# Altium footprint library ref-packages.PCBLIB: 1544 footprints (part 34 of 103)
Each footprint in its own frame and in the unit in brackets; x right, y up, seen from the top. Pads: shape width x height; smd on the part's side, far side on the other; paste and mask are expansions set on the pad; w line width, h text height; cw(c..) or ccw(c..) is an arc to the next point about the centre after c.
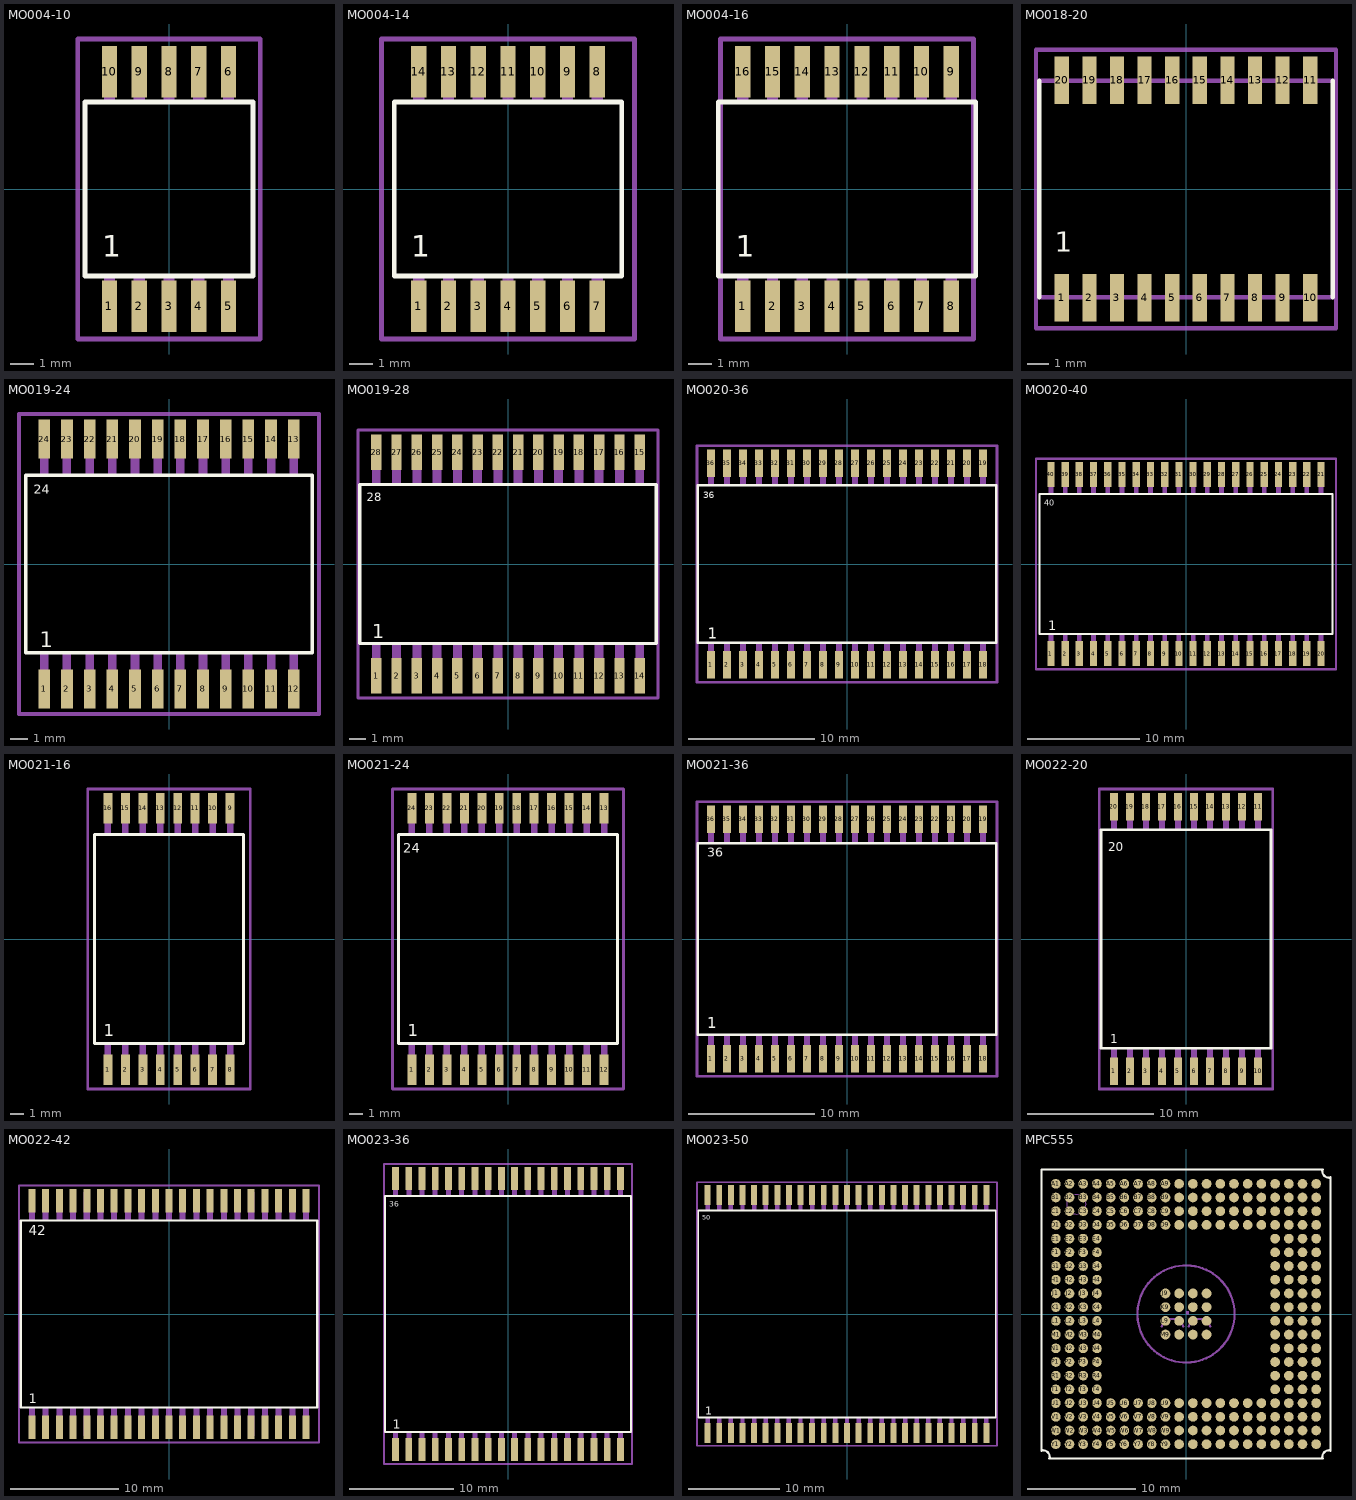
[diagram p33: the footprints below, top view; thin cyan lines are the x and y axes]

## MO004-10 [mm]
pads (10):
  rect 0.65x2.2 smd: 1(-2.54,-5) 2(-1.27,-5) 3(0,-5) 4(1.27,-5) 5(2.54,-5) 6(2.54,5) 7(1.27,5) 8(0,5) 9(-1.27,5) 10(-2.54,5)
Top Overlay:
  lines w0.203: -3.585,-3.71 3.585,-3.71 3.585,3.71 -3.585,3.71 -3.585,-3.71
  text "1" at -2.851,-3.205 h1.57
Mechanical 16:
  rectangle: -2.78,-5.8 -2.3,-3.71
  rectangle: -1.51,-5.8 -1.03,-3.71
  rectangle: -0.24,-5.8 0.24,-3.71
  rectangle: 1.03,-5.8 1.51,-3.71
  rectangle: 2.3,-5.8 2.78,-3.71
  rectangle: 2.3,3.71 2.78,5.8
  rectangle: 1.03,3.71 1.51,5.8
  rectangle: -0.24,3.71 0.24,5.8
  rectangle: -1.51,3.71 -1.03,5.8
  rectangle: -2.78,3.71 -2.3,5.8
Mechanical 27:
  lines w0.2: -3.9,-6.4 -3.9,6.4 3.9,6.4 3.9,-6.4 -3.9,-6.4

## MO004-14 [mm]
pads (14):
  rect 0.65x2.2 smd: 1(-3.81,-5) 2(-2.54,-5) 3(-1.27,-5) 4(0,-5) 5(1.27,-5) 6(2.54,-5) 7(3.81,-5) 8(3.81,5) 9(2.54,5) 10(1.27,5) 11(0,5) 12(-1.27,5) 13(-2.54,5) 14(-3.81,5)
Top Overlay:
  lines w0.203: -4.855,-3.71 4.855,-3.71 4.855,3.71 -4.855,3.71 -4.855,-3.71
  text "1" at -4.121,-3.205 h1.57
Mechanical 16:
  rectangle: -4.05,-5.8 -3.57,-3.71
  rectangle: -2.78,-5.8 -2.3,-3.71
  rectangle: -1.51,-5.8 -1.03,-3.71
  rectangle: -0.24,-5.8 0.24,-3.71
  rectangle: 1.03,-5.8 1.51,-3.71
  rectangle: 2.3,-5.8 2.78,-3.71
  rectangle: 3.57,-5.8 4.05,-3.71
  rectangle: 3.57,3.71 4.05,5.8
  rectangle: 2.3,3.71 2.78,5.8
  rectangle: 1.03,3.71 1.51,5.8
  rectangle: -0.24,3.71 0.24,5.8
  rectangle: -1.51,3.71 -1.03,5.8
  rectangle: -2.78,3.71 -2.3,5.8
  rectangle: -4.05,3.71 -3.57,5.8
Mechanical 27:
  lines w0.2: -5.4,-6.4 -5.4,6.4 5.4,6.4 5.4,-6.4 -5.4,-6.4

## MO004-16 [mm]
pads (16):
  rect 0.65x2.2 smd: 1(-4.445,-5) 2(-3.175,-5) 3(-1.905,-5) 4(-0.635,-5) 5(0.635,-5) 6(1.905,-5) 7(3.175,-5) 8(4.445,-5) 9(4.445,5) 10(3.175,5) 11(1.905,5) 12(0.635,5) 13(-0.635,5) 14(-1.905,5) 15(-3.175,5) 16(-4.445,5)
Top Overlay:
  lines w0.203: -5.49,-3.71 5.49,-3.71 5.49,3.71 -5.49,3.71 -5.49,-3.71
  text "1" at -4.756,-3.205 h1.57
Mechanical 16:
  rectangle: -4.685,-5.8 -4.205,-3.71
  rectangle: -3.415,-5.8 -2.935,-3.71
  rectangle: -2.145,-5.8 -1.665,-3.71
  rectangle: -0.875,-5.8 -0.395,-3.71
  rectangle: 0.395,-5.8 0.875,-3.71
  rectangle: 1.665,-5.8 2.145,-3.71
  rectangle: 2.935,-5.8 3.415,-3.71
  rectangle: 4.205,-5.8 4.685,-3.71
  rectangle: 4.205,3.71 4.685,5.8
  rectangle: 2.935,3.71 3.415,5.8
  rectangle: 1.665,3.71 2.145,5.8
  rectangle: 0.395,3.71 0.875,5.8
  rectangle: -0.875,3.71 -0.395,5.8
  rectangle: -2.145,3.71 -1.665,5.8
  rectangle: -3.415,3.71 -2.935,5.8
  rectangle: -4.685,3.71 -4.205,5.8
Mechanical 27:
  lines w0.2: -5.4,-6.4 -5.4,6.4 5.4,6.4 5.4,-6.4 -5.4,-6.4

## MO018-20 [mm]
pads (20):
  rect 0.65x2.2 smd: 1(-5.715,-5) 2(-4.445,-5) 3(-3.175,-5) 4(-1.905,-5) 5(-0.635,-5) 6(0.635,-5) 7(1.905,-5) 8(3.175,-5) 9(4.445,-5) 10(5.715,-5) 11(5.715,5) 12(4.445,5) 13(3.175,5) 14(1.905,5) 15(0.635,5) 16(-0.635,5) 17(-1.905,5) 18(-3.175,5) 19(-4.445,5) 20(-5.715,5)
Top Overlay:
  lines w0.203: -6.745,-4.98 -6.745,4.98 ; 6.745,-4.98 6.745,4.98
  text "1" at -6.026,-3.205 h1.57
Mechanical 16:
  rectangle: -5.885,-5.8 -5.545,-4.98
  rectangle: -4.615,-5.8 -4.275,-4.98
  rectangle: -3.345,-5.8 -3.005,-4.98
  rectangle: -2.075,-5.8 -1.735,-4.98
  rectangle: -0.805,-5.8 -0.465,-4.98
  rectangle: 0.465,-5.8 0.805,-4.98
  rectangle: 1.735,-5.8 2.075,-4.98
  rectangle: 3.005,-5.8 3.345,-4.98
  rectangle: 4.275,-5.8 4.615,-4.98
  rectangle: 5.545,-5.8 5.885,-4.98
  rectangle: 5.545,4.98 5.885,5.8
  rectangle: 4.275,4.98 4.615,5.8
  rectangle: 3.005,4.98 3.345,5.8
  rectangle: 1.735,4.98 2.075,5.8
  rectangle: 0.465,4.98 0.805,5.8
  rectangle: -0.805,4.98 -0.465,5.8
  rectangle: -2.075,4.98 -1.735,5.8
  rectangle: -3.345,4.98 -3.005,5.8
  rectangle: -4.615,4.98 -4.275,5.8
  rectangle: -5.885,4.98 -5.545,5.8
  lines w0.203: -6.745,-4.98 6.745,-4.98 ; -6.745,4.98 6.745,4.98
Mechanical 27:
  lines w0.2: -6.9,-6.4 -6.9,6.4 6.9,6.4 6.9,-6.4 -6.9,-6.4

## MO019-24 [mm]
pads (24):
  rect 0.65x2.2 smd: 1(-6.985,-7) 2(-5.715,-7) 3(-4.445,-7) 4(-3.175,-7) 5(-1.905,-7) 6(-0.635,-7) 7(0.635,-7) 8(1.905,-7) 9(3.175,-7) 10(4.445,-7) 11(5.715,-7) 12(6.985,-7) 13(6.985,7) 14(5.715,7) 15(4.445,7) 16(3.175,7) 17(1.905,7) 18(0.635,7) 19(-0.635,7) 20(-1.905,7) 21(-3.175,7) 22(-4.445,7) 23(-5.715,7) 24(-6.985,7)
Top Overlay:
  lines w0.203: -8.015,-4.98 8.015,-4.98 8.015,4.98 -8.015,4.98 -8.015,-4.98
  text "1" at -7.236,-4.665 h0.86
  text "24" at -7.576,3.93 h0.52
Mechanical 16:
  rectangle: -7.225,-7.8 -6.745,-5
  rectangle: -5.955,-7.8 -5.475,-5
  rectangle: -4.685,-7.8 -4.205,-5
  rectangle: -3.415,-7.8 -2.935,-5
  rectangle: -2.145,-7.8 -1.665,-5
  rectangle: -0.875,-7.8 -0.395,-5
  rectangle: 0.395,-7.8 0.875,-5
  rectangle: 1.665,-7.8 2.145,-5
  rectangle: 2.935,-7.8 3.415,-5
  rectangle: 4.205,-7.8 4.685,-5
  rectangle: 5.475,-7.8 5.955,-5
  rectangle: 6.745,-7.8 7.225,-5
  rectangle: 6.745,5 7.225,7.8
  rectangle: 5.475,5 5.955,7.8
  rectangle: 4.205,5 4.685,7.8
  rectangle: 2.935,5 3.415,7.8
  rectangle: 1.665,5 2.145,7.8
  rectangle: 0.395,5 0.875,7.8
  rectangle: -0.875,5 -0.395,7.8
  rectangle: -2.145,5 -1.665,7.8
  rectangle: -3.415,5 -2.935,7.8
  rectangle: -4.685,5 -4.205,7.8
  rectangle: -5.955,5 -5.475,7.8
  rectangle: -7.225,5 -6.745,7.8
Mechanical 27:
  lines w0.2: -8.4,-8.4 -8.4,8.4 8.4,8.4 8.4,-8.4 -8.4,-8.4

## MO019-28 [mm]
pads (28):
  rect 0.65x2.2 smd: 1(-8.255,-7) 2(-6.985,-7) 3(-5.715,-7) 4(-4.445,-7) 5(-3.175,-7) 6(-1.905,-7) 7(-0.635,-7) 8(0.635,-7) 9(1.905,-7) 10(3.175,-7) 11(4.445,-7) 12(5.715,-7) 13(6.985,-7) 14(8.255,-7) 15(8.255,7) 16(6.985,7) 17(5.715,7) 18(4.445,7) 19(3.175,7) 20(1.905,7) 21(0.635,7) 22(-0.635,7) 23(-1.905,7) 24(-3.175,7) 25(-4.445,7) 26(-5.715,7) 27(-6.985,7) 28(-8.255,7)
Top Overlay:
  lines w0.203: -9.285,-4.98 9.285,-4.98 9.285,4.98 -9.285,4.98 -9.285,-4.98
  text "1" at -8.506,-4.665 h0.86
  text "28" at -8.846,3.93 h0.52
Mechanical 16:
  rectangle: -8.535,-7.8 -7.975,-5
  rectangle: -7.265,-7.8 -6.705,-5
  rectangle: -5.995,-7.8 -5.435,-5
  rectangle: -4.725,-7.8 -4.165,-5
  rectangle: -3.455,-7.8 -2.895,-5
  rectangle: -2.185,-7.8 -1.625,-5
  rectangle: -0.915,-7.8 -0.355,-5
  rectangle: 0.355,-7.8 0.915,-5
  rectangle: 1.625,-7.8 2.185,-5
  rectangle: 2.895,-7.8 3.455,-5
  rectangle: 4.165,-7.8 4.725,-5
  rectangle: 5.435,-7.8 5.995,-5
  rectangle: 6.705,-7.8 7.265,-5
  rectangle: 7.975,-7.8 8.535,-5
  rectangle: 7.975,5 8.535,7.8
  rectangle: 6.705,5 7.265,7.8
  rectangle: 5.435,5 5.995,7.8
  rectangle: 4.165,5 4.725,7.8
  rectangle: 2.895,5 3.455,7.8
  rectangle: 1.625,5 2.185,7.8
  rectangle: 0.355,5 0.915,7.8
  rectangle: -0.915,5 -0.355,7.8
  rectangle: -2.185,5 -1.625,7.8
  rectangle: -3.455,5 -2.895,7.8
  rectangle: -4.725,5 -4.165,7.8
  rectangle: -5.995,5 -5.435,7.8
  rectangle: -7.265,5 -6.705,7.8
  rectangle: -8.535,5 -7.975,7.8
Mechanical 27:
  lines w0.2: -9.4,-8.4 -9.4,8.4 9.4,8.4 9.4,-8.4 -9.4,-8.4

## MO020-36 [mm]
pads (36):
  rect 0.65x2.2 smd: 1(-10.795,-8) 2(-9.525,-8) 3(-8.255,-8) 4(-6.985,-8) 5(-5.715,-8) 6(-4.445,-8) 7(-3.175,-8) 8(-1.905,-8) 9(-0.635,-8) 10(0.635,-8) 11(1.905,-8) 12(3.175,-8) 13(4.445,-8) 14(5.715,-8) 15(6.985,-8) 16(8.255,-8) 17(9.525,-8) 18(10.795,-8) 19(10.795,8) 20(9.525,8) 21(8.255,8) 22(6.985,8) 23(5.715,8) 24(4.445,8) 25(3.175,8) 26(1.905,8) 27(0.635,8) 28(-0.635,8) 29(-1.905,8) 30(-3.175,8) 31(-4.445,8) 32(-5.715,8) 33(-6.985,8) 34(-8.255,8) 35(-9.525,8) 36(-10.795,8)
Top Overlay:
  lines w0.203: -11.825,-6.25 11.825,-6.25 11.825,6.25 -11.825,6.25 -11.825,-6.25
  text "1" at -11.046,-5.935 h0.86
  text "36" at -11.386,5.2 h0.52
Mechanical 16:
  rectangle: -11.035,-8.8 -10.555,-6.25
  rectangle: -9.765,-8.8 -9.285,-6.25
  rectangle: -8.495,-8.8 -8.015,-6.25
  rectangle: -7.225,-8.8 -6.745,-6.25
  rectangle: -5.955,-8.8 -5.475,-6.25
  rectangle: -4.685,-8.8 -4.205,-6.25
  rectangle: -3.415,-8.8 -2.935,-6.25
  rectangle: -2.145,-8.8 -1.665,-6.25
  rectangle: -0.875,-8.8 -0.395,-6.25
  rectangle: 0.395,-8.8 0.875,-6.25
  rectangle: 1.665,-8.8 2.145,-6.25
  rectangle: 2.935,-8.8 3.415,-6.25
  rectangle: 4.205,-8.8 4.685,-6.25
  rectangle: 5.475,-8.8 5.955,-6.25
  rectangle: 6.745,-8.8 7.225,-6.25
  rectangle: 8.015,-8.8 8.495,-6.25
  rectangle: 9.285,-8.8 9.765,-6.25
  rectangle: 10.555,-8.8 11.035,-6.25
  rectangle: 10.555,6.25 11.035,8.8
  rectangle: 9.285,6.25 9.765,8.8
  rectangle: 8.015,6.25 8.495,8.8
  rectangle: 6.745,6.25 7.225,8.8
  rectangle: 5.475,6.25 5.955,8.8
  rectangle: 4.205,6.25 4.685,8.8
  rectangle: 2.935,6.25 3.415,8.8
  rectangle: 1.665,6.25 2.145,8.8
  rectangle: 0.395,6.25 0.875,8.8
  rectangle: -0.875,6.25 -0.395,8.8
  rectangle: -2.145,6.25 -1.665,8.8
  rectangle: -3.415,6.25 -2.935,8.8
  rectangle: -4.685,6.25 -4.205,8.8
  rectangle: -5.955,6.25 -5.475,8.8
  rectangle: -7.225,6.25 -6.745,8.8
  rectangle: -8.495,6.25 -8.015,8.8
  rectangle: -9.765,6.25 -9.285,8.8
  rectangle: -11.035,6.25 -10.555,8.8
Mechanical 27:
  lines w0.2: -11.9,-9.4 -11.9,9.4 11.9,9.4 11.9,-9.4 -11.9,-9.4

## MO020-40 [mm]
pads (40):
  rect 0.65x2.2 smd: 1(-12.065,-8) 2(-10.795,-8) 3(-9.525,-8) 4(-8.255,-8) 5(-6.985,-8) 6(-5.715,-8) 7(-4.445,-8) 8(-3.175,-8) 9(-1.905,-8) 10(-0.635,-8) 11(0.635,-8) 12(1.905,-8) 13(3.175,-8) 14(4.445,-8) 15(5.715,-8) 16(6.985,-8) 17(8.255,-8) 18(9.525,-8) 19(10.795,-8) 20(12.065,-8) 21(12.065,8) 22(10.795,8) 23(9.525,8) 24(8.255,8) 25(6.985,8) 26(5.715,8) 27(4.445,8) 28(3.175,8) 29(1.905,8) 30(0.635,8) 31(-0.635,8) 32(-1.905,8) 33(-3.175,8) 34(-4.445,8) 35(-5.715,8) 36(-6.985,8) 37(-8.255,8) 38(-9.525,8) 39(-10.795,8) 40(-12.065,8)
Top Overlay:
  lines w0.203: -13.095,-6.25 13.095,-6.25 13.095,6.25 -13.095,6.25 -13.095,-6.25
  text "1" at -12.316,-5.935 h0.86
  text "40" at -12.656,5.2 h0.52
Mechanical 16:
  rectangle: -12.275,-8.8 -11.855,-6.25
  rectangle: -11.005,-8.8 -10.585,-6.25
  rectangle: -9.735,-8.8 -9.315,-6.25
  rectangle: -8.465,-8.8 -8.045,-6.25
  rectangle: -7.195,-8.8 -6.775,-6.25
  rectangle: -5.925,-8.8 -5.505,-6.25
  rectangle: -4.655,-8.8 -4.235,-6.25
  rectangle: -3.385,-8.8 -2.965,-6.25
  rectangle: -2.115,-8.8 -1.695,-6.25
  rectangle: -0.845,-8.8 -0.425,-6.25
  rectangle: 0.425,-8.8 0.845,-6.25
  rectangle: 1.695,-8.8 2.115,-6.25
  rectangle: 2.965,-8.8 3.385,-6.25
  rectangle: 4.235,-8.8 4.655,-6.25
  rectangle: 5.505,-8.8 5.925,-6.25
  rectangle: 6.775,-8.8 7.195,-6.25
  rectangle: 8.045,-8.8 8.465,-6.25
  rectangle: 9.315,-8.8 9.735,-6.25
  rectangle: 10.585,-8.8 11.005,-6.25
  rectangle: 11.855,-8.8 12.275,-6.25
  rectangle: 11.855,6.25 12.275,8.8
  rectangle: 10.585,6.25 11.005,8.8
  rectangle: 9.315,6.25 9.735,8.8
  rectangle: 8.045,6.25 8.465,8.8
  rectangle: 6.775,6.25 7.195,8.8
  rectangle: 5.505,6.25 5.925,8.8
  rectangle: 4.235,6.25 4.655,8.8
  rectangle: 2.965,6.25 3.385,8.8
  rectangle: 1.695,6.25 2.115,8.8
  rectangle: 0.425,6.25 0.845,8.8
  rectangle: -0.845,6.25 -0.425,8.8
  rectangle: -2.115,6.25 -1.695,8.8
  rectangle: -3.385,6.25 -2.965,8.8
  rectangle: -4.655,6.25 -4.235,8.8
  rectangle: -5.925,6.25 -5.505,8.8
  rectangle: -7.195,6.25 -6.775,8.8
  rectangle: -8.465,6.25 -8.045,8.8
  rectangle: -9.735,6.25 -9.315,8.8
  rectangle: -11.005,6.25 -10.585,8.8
  rectangle: -12.275,6.25 -11.855,8.8
Mechanical 27:
  lines w0.2: -13.4,-9.4 -13.4,9.4 13.4,9.4 13.4,-9.4 -13.4,-9.4

## MO021-16 [mm]
pads (16):
  rect 0.65x2.2 smd: 1(-4.445,-9.5) 2(-3.175,-9.5) 3(-1.905,-9.5) 4(-0.635,-9.5) 5(0.635,-9.5) 6(1.905,-9.5) 7(3.175,-9.5) 8(4.445,-9.5) 9(4.445,9.5) 10(3.175,9.5) 11(1.905,9.5) 12(0.635,9.5) 13(-0.635,9.5) 14(-1.905,9.5) 15(-3.175,9.5) 16(-4.445,9.5)
Top Overlay:
  lines w0.203: -5.41,-7.585 5.41,-7.585 5.41,7.585 -5.41,7.585 -5.41,-7.585
  text "1" at -4.756,-7.07 h0.86
Mechanical 16:
  rectangle: -4.685,-10.3 -4.205,-7.6
  rectangle: -3.415,-10.3 -2.935,-7.6
  rectangle: -2.145,-10.3 -1.665,-7.6
  rectangle: -0.875,-10.3 -0.395,-7.6
  rectangle: 0.395,-10.3 0.875,-7.6
  rectangle: 1.665,-10.3 2.145,-7.6
  rectangle: 2.935,-10.3 3.415,-7.6
  rectangle: 4.205,-10.3 4.685,-7.6
  rectangle: 4.205,7.6 4.685,10.3
  rectangle: 2.935,7.6 3.415,10.3
  rectangle: 1.665,7.6 2.145,10.3
  rectangle: 0.395,7.6 0.875,10.3
  rectangle: -0.875,7.6 -0.395,10.3
  rectangle: -2.145,7.6 -1.665,10.3
  rectangle: -3.415,7.6 -2.935,10.3
  rectangle: -4.685,7.6 -4.205,10.3
Mechanical 27:
  lines w0.2: -5.9,-10.9 -5.9,10.9 5.9,10.9 5.9,-10.9 -5.9,-10.9

## MO021-24 [mm]
pads (24):
  rect 0.65x2.2 smd: 1(-6.985,-9.5) 2(-5.715,-9.5) 3(-4.445,-9.5) 4(-3.175,-9.5) 5(-1.905,-9.5) 6(-0.635,-9.5) 7(0.635,-9.5) 8(1.905,-9.5) 9(3.175,-9.5) 10(4.445,-9.5) 11(5.715,-9.5) 12(6.985,-9.5) 13(6.985,9.5) 14(5.715,9.5) 15(4.445,9.5) 16(3.175,9.5) 17(1.905,9.5) 18(0.635,9.5) 19(-0.635,9.5) 20(-1.905,9.5) 21(-3.175,9.5) 22(-4.445,9.5) 23(-5.715,9.5) 24(-6.985,9.5)
Top Overlay:
  lines w0.203: -7.95,-7.585 7.95,-7.585 7.95,7.585 -7.95,7.585 -7.95,-7.585
  text "1" at -7.296,-7.07 h0.86
  text "24" at -7.606,6.265 h0.69
Mechanical 16:
  rectangle: -7.225,-10.3 -6.745,-7.6
  rectangle: -5.955,-10.3 -5.475,-7.6
  rectangle: -4.685,-10.3 -4.205,-7.6
  rectangle: -3.415,-10.3 -2.935,-7.6
  rectangle: -2.145,-10.3 -1.665,-7.6
  rectangle: -0.875,-10.3 -0.395,-7.6
  rectangle: 0.395,-10.3 0.875,-7.6
  rectangle: 1.665,-10.3 2.145,-7.6
  rectangle: 2.935,-10.3 3.415,-7.6
  rectangle: 4.205,-10.3 4.685,-7.6
  rectangle: 5.475,-10.3 5.955,-7.6
  rectangle: 6.745,-10.3 7.225,-7.6
  rectangle: 6.745,7.6 7.225,10.3
  rectangle: 5.475,7.6 5.955,10.3
  rectangle: 4.205,7.6 4.685,10.3
  rectangle: 2.935,7.6 3.415,10.3
  rectangle: 1.665,7.6 2.145,10.3
  rectangle: 0.395,7.6 0.875,10.3
  rectangle: -0.875,7.6 -0.395,10.3
  rectangle: -2.145,7.6 -1.665,10.3
  rectangle: -3.415,7.6 -2.935,10.3
  rectangle: -4.685,7.6 -4.205,10.3
  rectangle: -5.955,7.6 -5.475,10.3
  rectangle: -7.225,7.6 -6.745,10.3
Mechanical 27:
  lines w0.2: -8.4,-10.9 -8.4,10.9 8.4,10.9 8.4,-10.9 -8.4,-10.9

## MO021-36 [mm]
pads (36):
  rect 0.65x2.2 smd: 1(-10.795,-9.5) 2(-9.525,-9.5) 3(-8.255,-9.5) 4(-6.985,-9.5) 5(-5.715,-9.5) 6(-4.445,-9.5) 7(-3.175,-9.5) 8(-1.905,-9.5) 9(-0.635,-9.5) 10(0.635,-9.5) 11(1.905,-9.5) 12(3.175,-9.5) 13(4.445,-9.5) 14(5.715,-9.5) 15(6.985,-9.5) 16(8.255,-9.5) 17(9.525,-9.5) 18(10.795,-9.5) 19(10.795,9.5) 20(9.525,9.5) 21(8.255,9.5) 22(6.985,9.5) 23(5.715,9.5) 24(4.445,9.5) 25(3.175,9.5) 26(1.905,9.5) 27(0.635,9.5) 28(-0.635,9.5) 29(-1.905,9.5) 30(-3.175,9.5) 31(-4.445,9.5) 32(-5.715,9.5) 33(-6.985,9.5) 34(-8.255,9.5) 35(-9.525,9.5) 36(-10.795,9.5)
Top Overlay:
  lines w0.203: -11.833,-7.585 11.833,-7.585 11.833,7.585 -11.833,7.585 -11.833,-7.585
  text "1" at -11.106,-7.07 h0.86
  text "36" at -11.106,6.265 h1.26
Mechanical 16:
  rectangle: -11.035,-10.3 -10.555,-7.6
  rectangle: -9.765,-10.3 -9.285,-7.6
  rectangle: -8.495,-10.3 -8.015,-7.6
  rectangle: -7.225,-10.3 -6.745,-7.6
  rectangle: -5.955,-10.3 -5.475,-7.6
  rectangle: -4.685,-10.3 -4.205,-7.6
  rectangle: -3.415,-10.3 -2.935,-7.6
  rectangle: -2.145,-10.3 -1.665,-7.6
  rectangle: -0.875,-10.3 -0.395,-7.6
  rectangle: 0.395,-10.3 0.875,-7.6
  rectangle: 1.665,-10.3 2.145,-7.6
  rectangle: 2.935,-10.3 3.415,-7.6
  rectangle: 4.205,-10.3 4.685,-7.6
  rectangle: 5.475,-10.3 5.955,-7.6
  rectangle: 6.745,-10.3 7.225,-7.6
  rectangle: 8.015,-10.3 8.495,-7.6
  rectangle: 9.285,-10.3 9.765,-7.6
  rectangle: 10.555,-10.3 11.035,-7.6
  rectangle: 10.555,7.6 11.035,10.3
  rectangle: 9.285,7.6 9.765,10.3
  rectangle: 8.015,7.6 8.495,10.3
  rectangle: 6.745,7.6 7.225,10.3
  rectangle: 5.475,7.6 5.955,10.3
  rectangle: 4.205,7.6 4.685,10.3
  rectangle: 2.935,7.6 3.415,10.3
  rectangle: 1.665,7.6 2.145,10.3
  rectangle: 0.395,7.6 0.875,10.3
  rectangle: -0.875,7.6 -0.395,10.3
  rectangle: -2.145,7.6 -1.665,10.3
  rectangle: -3.415,7.6 -2.935,10.3
  rectangle: -4.685,7.6 -4.205,10.3
  rectangle: -5.955,7.6 -5.475,10.3
  rectangle: -7.225,7.6 -6.745,10.3
  rectangle: -8.495,7.6 -8.015,10.3
  rectangle: -9.765,7.6 -9.285,10.3
  rectangle: -11.035,7.6 -10.555,10.3
Mechanical 27:
  lines w0.2: -11.9,-10.9 -11.9,10.9 11.9,10.9 11.9,-10.9 -11.9,-10.9

## MO022-20 [mm]
pads (20):
  rect 0.65x2.2 smd: 1(-5.715,-10.5) 2(-4.445,-10.5) 3(-3.175,-10.5) 4(-1.905,-10.5) 5(-0.635,-10.5) 6(0.635,-10.5) 7(1.905,-10.5) 8(3.175,-10.5) 9(4.445,-10.5) 10(5.715,-10.5) 11(5.715,10.5) 12(4.445,10.5) 13(3.175,10.5) 14(1.905,10.5) 15(0.635,10.5) 16(-0.635,10.5) 17(-1.905,10.5) 18(-3.175,10.5) 19(-4.445,10.5) 20(-5.715,10.5)
Top Overlay:
  lines w0.203: -6.745,-8.655 6.745,-8.655 6.745,8.655 -6.745,8.655 -6.745,-8.655
  text "1" at -6.026,-8.285 h0.69
  text "20" at -6.161,6.955 h0.69
Mechanical 16:
  rectangle: -5.955,-11.3 -5.475,-8.6
  rectangle: -4.685,-11.3 -4.205,-8.6
  rectangle: -3.415,-11.3 -2.935,-8.6
  rectangle: -2.145,-11.3 -1.665,-8.6
  rectangle: -0.875,-11.3 -0.395,-8.6
  rectangle: 0.395,-11.3 0.875,-8.6
  rectangle: 1.665,-11.3 2.145,-8.6
  rectangle: 2.935,-11.3 3.415,-8.6
  rectangle: 4.205,-11.3 4.685,-8.6
  rectangle: 5.475,-11.3 5.955,-8.6
  rectangle: 5.475,8.6 5.955,11.3
  rectangle: 4.205,8.6 4.685,11.3
  rectangle: 2.935,8.6 3.415,11.3
  rectangle: 1.665,8.6 2.145,11.3
  rectangle: 0.395,8.6 0.875,11.3
  rectangle: -0.875,8.6 -0.395,11.3
  rectangle: -2.145,8.6 -1.665,11.3
  rectangle: -3.415,8.6 -2.935,11.3
  rectangle: -4.685,8.6 -4.205,11.3
  rectangle: -5.955,8.6 -5.475,11.3
Mechanical 27:
  lines w0.2: -6.9,-11.9 -6.9,11.9 6.9,11.9 6.9,-11.9 -6.9,-11.9

## MO022-42 [mm]
pads (42):
  rect 0.65x2.2 smd: 1(-12.7,-10.5) 2(-11.43,-10.5) 3(-10.16,-10.5) 4(-8.89,-10.5) 5(-7.62,-10.5) 6(-6.35,-10.5) 7(-5.08,-10.5) 8(-3.81,-10.5) 9(-2.54,-10.5) 10(-1.27,-10.5) 11(0,-10.5) 12(1.27,-10.5) 13(2.54,-10.5) 14(3.81,-10.5) 15(5.08,-10.5) 16(6.35,-10.5) 17(7.62,-10.5) 18(8.89,-10.5) 19(10.16,-10.5) 20(11.43,-10.5) 21(12.7,-10.5) 22(12.7,10.5) 23(11.43,10.5) 24(10.16,10.5) 25(8.89,10.5) 26(7.62,10.5) 27(6.35,10.5) 28(5.08,10.5) 29(3.81,10.5) 30(2.54,10.5) 31(1.27,10.5) 32(0,10.5) 33(-1.27,10.5) 34(-2.54,10.5) 35(-3.81,10.5) 36(-5.08,10.5) 37(-6.35,10.5) 38(-7.62,10.5) 39(-8.89,10.5) 40(-10.16,10.5) 41(-11.43,10.5) 42(-12.7,10.5)
Top Overlay:
  lines w0.203: -13.73,-8.655 13.73,-8.655 13.73,8.655 -13.73,8.655 -13.73,-8.655
  text "1" at -13.011,-8.285 h0.86
  text "42" at -13.011,6.955 h1.57
Mechanical 16:
  rectangle: -12.98,-11.3 -12.42,-8.6
  rectangle: -11.71,-11.3 -11.15,-8.6
  rectangle: -10.44,-11.3 -9.88,-8.6
  rectangle: -9.17,-11.3 -8.61,-8.6
  rectangle: -7.9,-11.3 -7.34,-8.6
  rectangle: -6.63,-11.3 -6.07,-8.6
  rectangle: -5.36,-11.3 -4.8,-8.6
  rectangle: -4.09,-11.3 -3.53,-8.6
  rectangle: -2.82,-11.3 -2.26,-8.6
  rectangle: -1.55,-11.3 -0.99,-8.6
  rectangle: -0.28,-11.3 0.28,-8.6
  rectangle: 0.99,-11.3 1.55,-8.6
  rectangle: 2.26,-11.3 2.82,-8.6
  rectangle: 3.53,-11.3 4.09,-8.6
  rectangle: 4.8,-11.3 5.36,-8.6
  rectangle: 6.07,-11.3 6.63,-8.6
  rectangle: 7.34,-11.3 7.9,-8.6
  rectangle: 8.61,-11.3 9.17,-8.6
  rectangle: 9.88,-11.3 10.44,-8.6
  rectangle: 11.15,-11.3 11.71,-8.6
  rectangle: 12.42,-11.3 12.98,-8.6
  rectangle: 12.42,8.6 12.98,11.3
  rectangle: 11.15,8.6 11.71,11.3
  rectangle: 9.88,8.6 10.44,11.3
  rectangle: 8.61,8.6 9.17,11.3
  rectangle: 7.34,8.6 7.9,11.3
  rectangle: 6.07,8.6 6.63,11.3
  rectangle: 4.8,8.6 5.36,11.3
  rectangle: 3.53,8.6 4.09,11.3
  rectangle: 2.26,8.6 2.82,11.3
  rectangle: 0.99,8.6 1.55,11.3
  rectangle: -0.28,8.6 0.28,11.3
  rectangle: -1.55,8.6 -0.99,11.3
  rectangle: -2.82,8.6 -2.26,11.3
  rectangle: -4.09,8.6 -3.53,11.3
  rectangle: -5.36,8.6 -4.8,11.3
  rectangle: -6.63,8.6 -6.07,11.3
  rectangle: -7.9,8.6 -7.34,11.3
  rectangle: -9.17,8.6 -8.61,11.3
  rectangle: -10.44,8.6 -9.88,11.3
  rectangle: -11.71,8.6 -11.15,11.3
  rectangle: -12.98,8.6 -12.42,11.3
Mechanical 27:
  lines w0.2: -13.9,-11.9 -13.9,11.9 13.9,11.9 13.9,-11.9 -13.9,-11.9

## MO023-36 [mm]
pads (36):
  rect 0.65x2.2 smd: 1(-10.795,-13) 2(-9.525,-13) 3(-8.255,-13) 4(-6.985,-13) 5(-5.715,-13) 6(-4.445,-13) 7(-3.175,-13) 8(-1.905,-13) 9(-0.635,-13) 10(0.635,-13) 11(1.905,-13) 12(3.175,-13) 13(4.445,-13) 14(5.715,-13) 15(6.985,-13) 16(8.255,-13) 17(9.525,-13) 18(10.795,-13) 19(10.795,13) 20(9.525,13) 21(8.255,13) 22(6.985,13) 23(5.715,13) 24(4.445,13) 25(3.175,13) 26(1.905,13) 27(0.635,13) 28(-0.635,13) 29(-1.905,13) 30(-3.175,13) 31(-4.445,13) 32(-5.715,13) 33(-6.985,13) 34(-8.255,13) 35(-9.525,13) 36(-10.795,13)
Top Overlay:
  lines w0.203: -11.825,-11.33 11.825,-11.33 11.825,11.33 -11.825,11.33 -11.825,-11.33
  text "1" at -11.046,-11.015 h0.86
  text "36" at -11.386,10.28 h0.52
Mechanical 16:
  rectangle: -11.035,-13.8 -10.555,-11.25
  rectangle: -9.765,-13.8 -9.285,-11.25
  rectangle: -8.495,-13.8 -8.015,-11.25
  rectangle: -7.225,-13.8 -6.745,-11.25
  rectangle: -5.955,-13.8 -5.475,-11.25
  rectangle: -4.685,-13.8 -4.205,-11.25
  rectangle: -3.415,-13.8 -2.935,-11.25
  rectangle: -2.145,-13.8 -1.665,-11.25
  rectangle: -0.875,-13.8 -0.395,-11.25
  rectangle: 0.395,-13.8 0.875,-11.25
  rectangle: 1.665,-13.8 2.145,-11.25
  rectangle: 2.935,-13.8 3.415,-11.25
  rectangle: 4.205,-13.8 4.685,-11.25
  rectangle: 5.475,-13.8 5.955,-11.25
  rectangle: 6.745,-13.8 7.225,-11.25
  rectangle: 8.015,-13.8 8.495,-11.25
  rectangle: 9.285,-13.8 9.765,-11.25
  rectangle: 10.555,-13.8 11.035,-11.25
  rectangle: 10.555,11.25 11.035,13.8
  rectangle: 9.285,11.25 9.765,13.8
  rectangle: 8.015,11.25 8.495,13.8
  rectangle: 6.745,11.25 7.225,13.8
  rectangle: 5.475,11.25 5.955,13.8
  rectangle: 4.205,11.25 4.685,13.8
  rectangle: 2.935,11.25 3.415,13.8
  rectangle: 1.665,11.25 2.145,13.8
  rectangle: 0.395,11.25 0.875,13.8
  rectangle: -0.875,11.25 -0.395,13.8
  rectangle: -2.145,11.25 -1.665,13.8
  rectangle: -3.415,11.25 -2.935,13.8
  rectangle: -4.685,11.25 -4.205,13.8
  rectangle: -5.955,11.25 -5.475,13.8
  rectangle: -7.225,11.25 -6.745,13.8
  rectangle: -8.495,11.25 -8.015,13.8
  rectangle: -9.765,11.25 -9.285,13.8
  rectangle: -11.035,11.25 -10.555,13.8
Mechanical 27:
  lines w0.2: -11.9,-14.4 -11.9,14.4 11.9,14.4 11.9,-14.4 -11.9,-14.4

## MO023-50 [mm]
pads (50):
  rect 0.65x2.2 smd: 1(-15.24,-13) 2(-13.97,-13) 3(-12.7,-13) 4(-11.43,-13) 5(-10.16,-13) 6(-8.89,-13) 7(-7.62,-13) 8(-6.35,-13) 9(-5.08,-13) 10(-3.81,-13) 11(-2.54,-13) 12(-1.27,-13) 13(0,-13) 14(1.27,-13) 15(2.54,-13) 16(3.81,-13) 17(5.08,-13) 18(6.35,-13) 19(7.62,-13) 20(8.89,-13) 21(10.16,-13) 22(11.43,-13) 23(12.7,-13) 24(13.97,-13) 25(15.24,-13) 26(15.24,13) 27(13.97,13) 28(12.7,13) 29(11.43,13) 30(10.16,13) 31(8.89,13) 32(7.62,13) 33(6.35,13) 34(5.08,13) 35(3.81,13) 36(2.54,13) 37(1.27,13) 38(0,13) 39(-1.27,13) 40(-2.54,13) 41(-3.81,13) 42(-5.08,13) 43(-6.35,13) 44(-7.62,13) 45(-8.89,13) 46(-10.16,13) 47(-11.43,13) 48(-12.7,13) 49(-13.97,13) 50(-15.24,13)
Top Overlay:
  lines w0.203: -16.27,-11.33 16.27,-11.33 16.27,11.33 -16.27,11.33 -16.27,-11.33
  text "1" at -15.491,-11.015 h0.86
  text "50" at -15.831,10.28 h0.52
Mechanical 16:
  rectangle: -15.48,-13.8 -15,-11.25
  rectangle: -14.21,-13.8 -13.73,-11.25
  rectangle: -12.94,-13.8 -12.46,-11.25
  rectangle: -11.67,-13.8 -11.19,-11.25
  rectangle: -10.4,-13.8 -9.92,-11.25
  rectangle: -9.13,-13.8 -8.65,-11.25
  rectangle: -7.86,-13.8 -7.38,-11.25
  rectangle: -6.59,-13.8 -6.11,-11.25
  rectangle: -5.32,-13.8 -4.84,-11.25
  rectangle: -4.05,-13.8 -3.57,-11.25
  rectangle: -2.78,-13.8 -2.3,-11.25
  rectangle: -1.51,-13.8 -1.03,-11.25
  rectangle: -0.24,-13.8 0.24,-11.25
  rectangle: 1.03,-13.8 1.51,-11.25
  rectangle: 2.3,-13.8 2.78,-11.25
  rectangle: 3.57,-13.8 4.05,-11.25
  rectangle: 4.84,-13.8 5.32,-11.25
  rectangle: 6.11,-13.8 6.59,-11.25
  rectangle: 7.38,-13.8 7.86,-11.25
  rectangle: 8.65,-13.8 9.13,-11.25
  rectangle: 9.92,-13.8 10.4,-11.25
  rectangle: 11.19,-13.8 11.67,-11.25
  rectangle: 12.46,-13.8 12.94,-11.25
  rectangle: 13.73,-13.8 14.21,-11.25
  rectangle: 15,-13.8 15.48,-11.25
  rectangle: 15,11.25 15.48,13.8
  rectangle: 13.73,11.25 14.21,13.8
  rectangle: 12.46,11.25 12.94,13.8
  rectangle: 11.19,11.25 11.67,13.8
  rectangle: 9.92,11.25 10.4,13.8
  rectangle: 8.65,11.25 9.13,13.8
  rectangle: 7.38,11.25 7.86,13.8
  rectangle: 6.11,11.25 6.59,13.8
  rectangle: 4.84,11.25 5.32,13.8
  rectangle: 3.57,11.25 4.05,13.8
  rectangle: 2.3,11.25 2.78,13.8
  rectangle: 1.03,11.25 1.51,13.8
  rectangle: -0.24,11.25 0.24,13.8
  rectangle: -1.51,11.25 -1.03,13.8
  rectangle: -2.78,11.25 -2.3,13.8
  rectangle: -4.05,11.25 -3.57,13.8
  rectangle: -5.32,11.25 -4.84,13.8
  rectangle: -6.59,11.25 -6.11,13.8
  rectangle: -7.86,11.25 -7.38,13.8
  rectangle: -9.13,11.25 -8.65,13.8
  rectangle: -10.4,11.25 -9.92,13.8
  rectangle: -11.67,11.25 -11.19,13.8
  rectangle: -12.94,11.25 -12.46,13.8
  rectangle: -14.21,11.25 -13.73,13.8
  rectangle: -15.48,11.25 -15,13.8
Mechanical 27:
  lines w0.2: -16.4,-14.4 -16.4,14.4 16.4,14.4 16.4,-14.4 -16.4,-14.4

## MPC555 [mil]
pads (272):
  rrect100% 35.43x35.43 smd: A1(-475,475) A2(-425,475) A3(-375,475) A4(-325,475) A5(-275,475) A6(-225,475) A7(-175,475) A8(-125,475) A9(-75,475) A10(-25,475) A11(25,475) A12(75,475) A13(125,475) A14(175,475) A15(225,475) A16(275,475) A17(325,475) A18(375,475) A19(425,475) A20(475,475) B1(-475,425) B2(-425,425) B3(-375,425) B4(-325,425) B5(-275,425) B6(-225,425) B7(-175,425) B8(-125,425) B9(-75,425) B10(-25,425) B11(25,425) B12(75,425) B13(125,425) B14(175,425) B15(225,425) B16(275,425) B17(325,425) B18(375,425) B19(425,425) B20(475,425) C1(-475,375) C2(-425,375) C3(-375,375) C4(-325,375) C5(-275,375) C6(-225,375) C7(-175,375) C8(-125,375) C9(-75,375) C10(-25,375) C11(25,375) C12(75,375) C13(125,375) C14(175,375) C15(225,375) C16(275,375) C17(325,375) C18(375,375) C19(425,375) C20(475,375) D1(-475,325) D2(-425,325) D3(-375,325) D4(-325,325) D5(-275,325) D6(-225,325) D7(-175,325) D8(-125,325) D9(-75,325) D10(-25,325) D11(25,325) D12(75,325) D13(125,325) D14(175,325) D15(225,325) D16(275,325) D17(325,325) D18(375,325) D19(425,325) D20(475,325) E1(-475,275) E2(-425,275) E3(-375,275) E4(-325,275) E17(325,275) E18(375,275) E19(425,275) E20(475,275) F1(-475,225) F2(-425,225) F3(-375,225) F4(-325,225) F17(325,225) F18(375,225) F19(425,225) F20(475,225) G1(-475,175) G2(-425,175) G3(-375,175) G4(-325,175) G17(325,175) G18(375,175) G19(425,175) G20(475,175) H1(-475,125) H2(-425,125) H3(-375,125) H4(-325,125) H17(325,125) H18(375,125) H19(425,125) H20(475,125) J1(-475,75) J2(-425,75) J3(-375,75) J4(-325,75) J9(-75,75) J10(-25,75) J11(25,75) J12(75,75) J17(325,75) J18(375,75) J19(425,75) J20(475,75) K1(-475,25) K2(-425,25) K3(-375,25) K4(-325,25) K9(-75,25) K10(-25,25) K11(25,25) K12(75,25) K17(325,25) K18(375,25) K19(425,25) K20(475,25) L1(-475,-25) L2(-425,-25) L3(-375,-25) L4(-325,-25) L9(-75,-25) L10(-25,-25) L11(25,-25) L12(75,-25) L17(325,-25) L18(375,-25) L19(425,-25) L20(475,-25) M1(-475,-75) M2(-425,-75) M3(-375,-75) M4(-325,-75) M9(-75,-75) M10(-25,-75) M11(25,-75) M12(75,-75) M17(325,-75) M18(375,-75) M19(425,-75) M20(475,-75) N1(-475,-125) N2(-425,-125) N3(-375,-125) N4(-325,-125) N17(325,-125) N18(375,-125) N19(425,-125) N20(475,-125) P1(-475,-175) P2(-425,-175) P3(-375,-175) P4(-325,-175) P17(325,-175) P18(375,-175) P19(425,-175) P20(475,-175) R1(-475,-225) R2(-425,-225) R3(-375,-225) R4(-325,-225) R17(325,-225) R18(375,-225) R19(425,-225) R20(475,-225) T1(-475,-275) T2(-425,-275) T3(-375,-275) T4(-325,-275) T17(325,-275) T18(375,-275) T19(425,-275) T20(475,-275) U1(-475,-325) U2(-425,-325) U3(-375,-325) U4(-325,-325) U5(-275,-325) U6(-225,-325) U7(-175,-325) U8(-125,-325) U9(-75,-325) U10(-25,-325) U11(25,-325) U12(75,-325) U13(125,-325) U14(175,-325) U15(225,-325) U16(275,-325) U17(325,-325) U18(375,-325) U19(425,-325) U20(475,-325) V1(-475,-375) V2(-425,-375) V3(-375,-375) V4(-325,-375) V5(-275,-375) V6(-225,-375) V7(-175,-375) V8(-125,-375) V9(-75,-375) V10(-25,-375) V11(25,-375) V12(75,-375) V13(125,-375) V14(175,-375) V15(225,-375) V16(275,-375) V17(325,-375) V18(375,-375) V19(425,-375) V20(475,-375) W1(-475,-425) W2(-425,-425) W3(-375,-425) W4(-325,-425) W5(-275,-425) W6(-225,-425) W7(-175,-425) W8(-125,-425) W9(-75,-425) W10(-25,-425) W11(25,-425) W12(75,-425) W13(125,-425) W14(175,-425) W15(225,-425) W16(275,-425) W17(325,-425) W18(375,-425) W19(425,-425) W20(475,-425) Y1(-475,-475) Y2(-425,-475) Y3(-375,-475) Y4(-325,-475) Y5(-275,-475) Y6(-225,-475) Y7(-175,-475) Y8(-125,-475) Y9(-75,-475) Y10(-25,-475) Y11(25,-475) Y12(75,-475) Y13(125,-475) Y14(175,-475) Y15(225,-475) Y16(275,-475) Y17(325,-475) Y18(375,-475) Y19(425,-475) Y20(475,-475)
Top Overlay:
  lines w8: -527.56,-500 -527.56,527.56 500,527.56 ; -522.17,-497.17 cw(c-522.17,-522.17) -497.17,-522.17 ; -500,-527.56 500,-527.56 ; 497.17,-522.17 cw(c522.17,-522.17) 522.17,-497.17 ; 497.17,522.17 ccw(c522.17,522.17) 522.17,497.17 ; 527.56,-500 527.56,500
Mechanical 16:
  circle w0: c-400,400 r35.35
  circle w8: c0,0 r177.17
  region: 0,0 10,0 10,10 0,10
  region: 0,0 10,0 10,10 0,10
  lines w8: -88.58,-45.21 cw(c-49.21,-60.01) -9.84,-45.21 ; 9.84,-45.21 cw(c49.21,-60.01) 88.58,-45.21
  text "CASE 1135A-01" at -125,-225 h37.2